# Altium footprint library con-molex.PCBLIB: 369 footprints (part 11 of 26)
Each footprint in its own frame and in the unit in brackets; x right, y up, seen from the top. Pads: shape width x height; smd on the part's side, far side on the other; paste and mask are expansions set on the pad; w line width, h text height; cw(c..) or ccw(c..) is an arc to the next point about the centre after c.
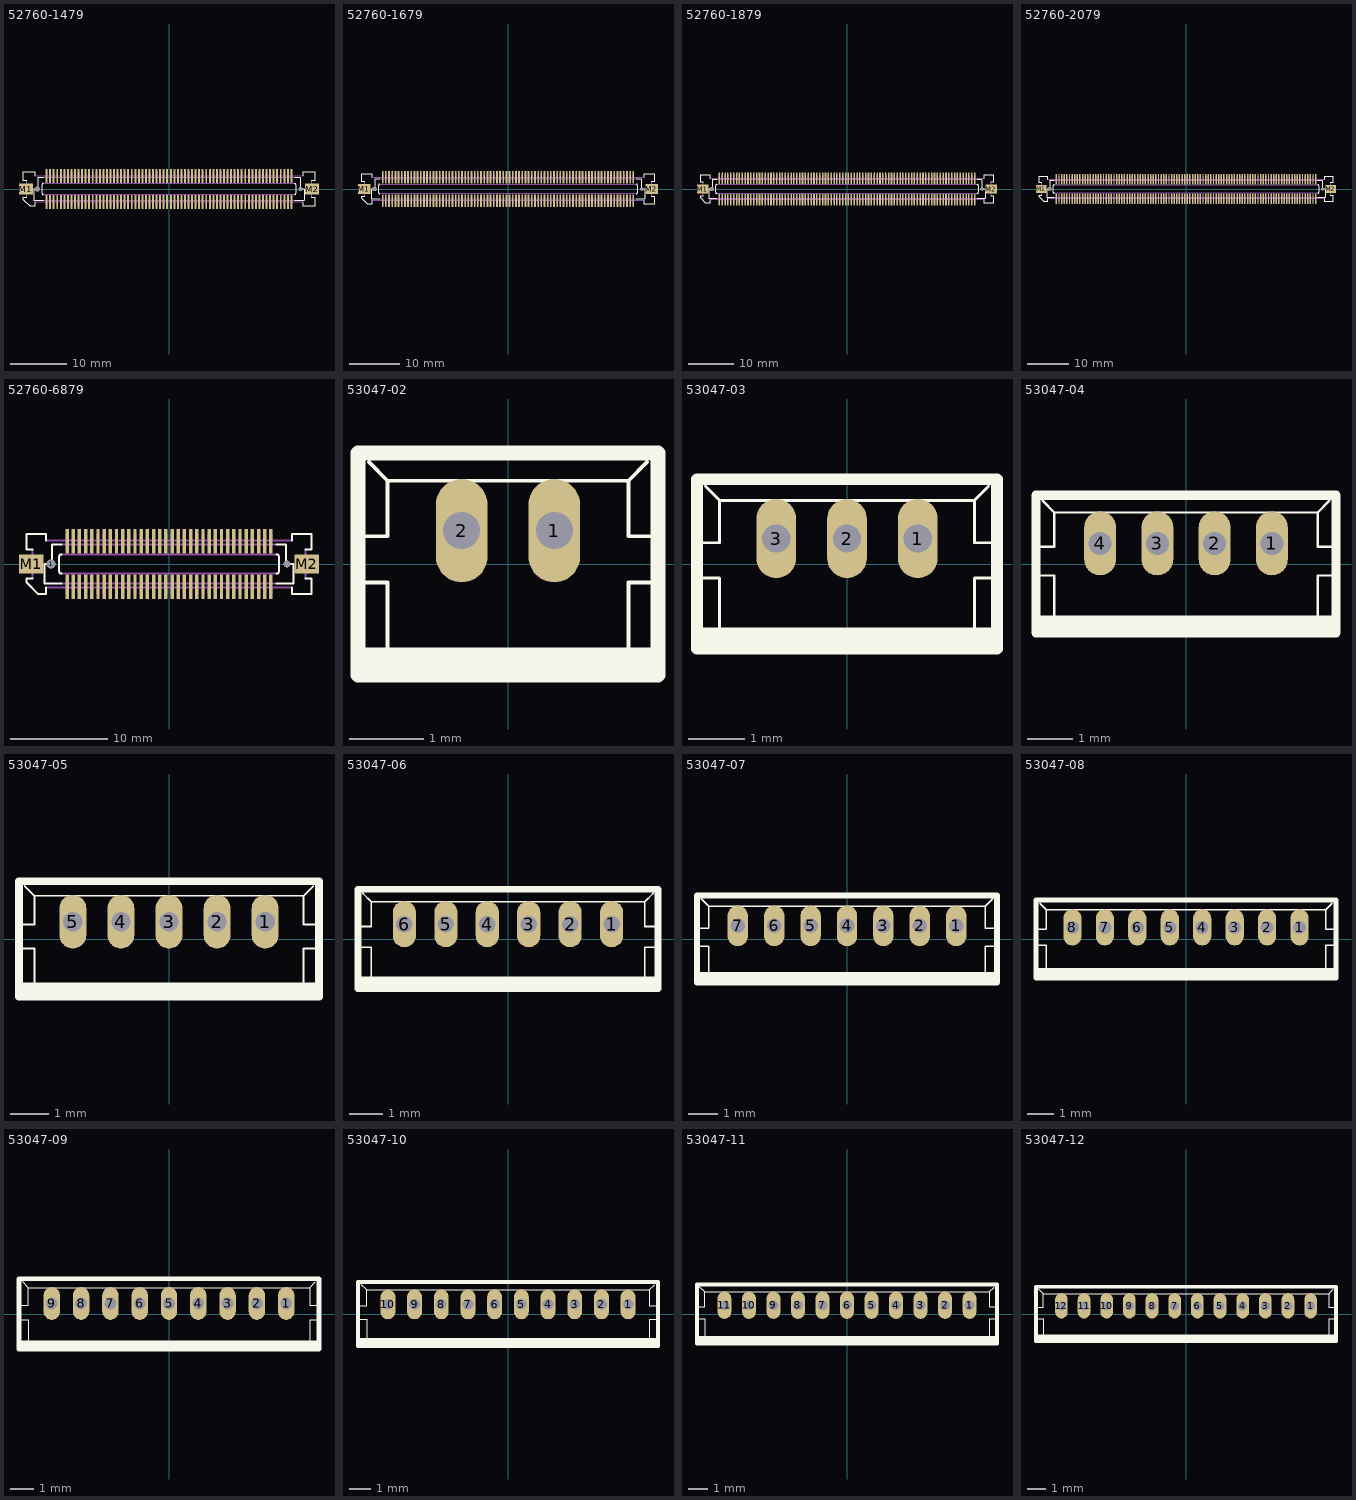
[diagram p10: the footprints below, top view; thin cyan lines are the x and y axes]

## 52760-1479 [mm]
pads (144):
  round 0.9 hole 0.9: 1(-23.56,0)
  rect 0.35x2.5 smd: 1(-21.907,-2.35) 2(-21.907,2.35) 3(-21.273,-2.35) 4(-21.273,2.35) 5(-20.637,-2.35) 6(-20.637,2.35) 7(-20.002,-2.35) 8(-20.002,2.35) 9(-19.367,-2.35) 10(-19.367,2.35) 11(-18.732,-2.35) 12(-18.732,2.35) 13(-18.098,-2.35) 14(-18.098,2.35) 15(-17.462,-2.35) 16(-17.462,2.35) 17(-16.828,-2.35) 18(-16.828,2.35) 19(-16.192,-2.35) 20(-16.192,2.35) 21(-15.557,-2.35) 22(-15.557,2.35) 23(-14.922,-2.35) 24(-14.922,2.35) 25(-14.287,-2.35) 26(-14.287,2.35) 27(-13.652,-2.35) 28(-13.652,2.35) 29(-13.018,-2.35) 30(-13.018,2.35) 31(-12.383,-2.35) 32(-12.383,2.35) 33(-11.747,-2.35) 34(-11.747,2.35) 35(-11.112,-2.35) 36(-11.112,2.35) 37(-10.477,-2.35) 38(-10.477,2.35) 39(-9.842,-2.35) 40(-9.842,2.35) 41(-9.207,-2.35) 42(-9.207,2.35) 43(-8.572,-2.35) 44(-8.572,2.35) 45(-7.938,-2.35) 46(-7.938,2.35) 47(-7.302,-2.35) 48(-7.302,2.35) 49(-6.667,-2.35) 50(-6.667,2.35) 51(-6.032,-2.35) 52(-6.032,2.35) 53(-5.397,-2.35) 54(-5.397,2.35) 55(-4.763,-2.35) 56(-4.763,2.35) 57(-4.127,-2.35) 58(-4.127,2.35) 59(-3.492,-2.35) 60(-3.492,2.35) 61(-2.857,-2.35) 62(-2.857,2.35) 63(-2.222,-2.35) 64(-2.222,2.35) 65(-1.587,-2.35) 66(-1.587,2.35) 67(-0.953,-2.35) 68(-0.953,2.35) 69(-0.318,-2.35) 70(-0.318,2.35) 71(0.318,-2.35) 72(0.318,2.35) 73(0.953,-2.35) 74(0.953,2.35) 75(1.587,-2.35) 76(1.587,2.35) 77(2.222,-2.35) 78(2.222,2.35) 79(2.857,-2.35) 80(2.857,2.35) 81(3.492,-2.35) 82(3.492,2.35) 83(4.127,-2.35) 84(4.127,2.35) 85(4.763,-2.35) 86(4.763,2.35) 87(5.397,-2.35) 88(5.397,2.35) 89(6.032,-2.35) 90(6.032,2.35) 91(6.667,-2.35) 92(6.667,2.35) 93(7.302,-2.35) 94(7.302,2.35) 95(7.938,-2.35) 96(7.938,2.35) 97(8.572,-2.35) 98(8.572,2.35) 99(9.207,-2.35) 100(9.207,2.35) 101(9.842,-2.35) 102(9.842,2.35) 103(10.477,-2.35) 104(10.477,2.35) 105(11.112,-2.35) 106(11.112,2.35) 107(11.747,-2.35) 108(11.747,2.35) 109(12.383,-2.35) 110(12.383,2.35) 111(13.018,-2.35) 112(13.018,2.35) 113(13.652,-2.35) 114(13.652,2.35) 115(14.287,-2.35) 116(14.287,2.35) 117(14.922,-2.35) 118(14.922,2.35) 119(15.557,-2.35) 120(15.557,2.35) 121(16.192,-2.35) 122(16.192,2.35) 123(16.828,-2.35) 124(16.828,2.35) 125(17.462,-2.35) 126(17.462,2.35) 127(18.098,-2.35) 128(18.098,2.35) 129(18.732,-2.35) 130(18.732,2.35) 131(19.367,-2.35) 132(19.367,2.35) 133(20.002,-2.35) 134(20.002,2.35) 135(20.637,-2.35) 136(20.637,2.35) 137(21.273,-2.35) 138(21.273,2.35) 139(21.907,-2.35) 140(21.907,2.35)
  round 0.7 hole 0.7: 1(23.56,0)
  rect 2.5x2 smd: M1(-25.6,0) M2(25.6,0)
Top Overlay:
  lines w0.203: -25.475,-1.5 -26.075,-1.5 -26.075,-1.9 -24.875,-3.1 -24.075,-3.1 -24.075,-2.4 ; -25.475,1.5 -26.075,1.5 -26.075,3.1 -24.075,3.1 -24.075,2.4 ; -22.475,-2 -24.225,-2 -24.225,0 -23.475,0 -23.475,2 -22.475,2 ; -22.475,-1 cw(c-22.475,-0.75) -22.725,-0.75 -22.725,0.75 cw(c-22.475,0.75) -22.475,1 ; 22.475,-2 24.225,-2 24.225,0 23.475,0 23.475,2 22.475,2 ; 22.475,-1 ccw(c22.475,-0.75) 22.725,-0.75 22.725,0.75 ccw(c22.475,0.75) 22.475,1 ; 24.075,-2.4 24.075,-3.1 26.075,-3.1 26.075,-1.5 25.475,-1.5 ; 24.075,2.4 24.075,3.1 26.075,3.1 26.075,1.5 25.475,1.5
Top Solder:
  rectangle: -22.107,-3.625 -21.708,-1.075
  region: -21.708,3.625 -22.107,3.625 -22.107,1.075 -21.708,1.075
  rectangle: -21.472,-3.625 -21.073,-1.075
  region: -21.073,3.625 -21.472,3.625 -21.472,1.075 -21.073,1.075
  rectangle: -20.837,-3.625 -20.438,-1.075
  region: -20.438,3.625 -20.837,3.625 -20.837,1.075 -20.438,1.075
  rectangle: -20.202,-3.625 -19.803,-1.075
  region: -19.803,3.625 -20.202,3.625 -20.202,1.075 -19.803,1.075
  rectangle: -19.567,-3.625 -19.168,-1.075
  region: -19.168,3.625 -19.567,3.625 -19.567,1.075 -19.168,1.075
  rectangle: -18.932,-3.625 -18.533,-1.075
  region: -18.533,3.625 -18.932,3.625 -18.932,1.075 -18.533,1.075
  rectangle: -18.297,-3.625 -17.898,-1.075
  region: -17.898,3.625 -18.297,3.625 -18.297,1.075 -17.898,1.075
  rectangle: -17.662,-3.625 -17.263,-1.075
  region: -17.263,3.625 -17.662,3.625 -17.662,1.075 -17.263,1.075
  rectangle: -17.027,-3.625 -16.628,-1.075
  region: -16.628,3.625 -17.027,3.625 -17.027,1.075 -16.628,1.075
  rectangle: -16.392,-3.625 -15.993,-1.075
  region: -15.993,3.625 -16.392,3.625 -16.392,1.075 -15.993,1.075
  rectangle: -15.757,-3.625 -15.358,-1.075
  region: -15.358,3.625 -15.757,3.625 -15.757,1.075 -15.358,1.075
  rectangle: -15.122,-3.625 -14.723,-1.075
  region: -14.723,3.625 -15.122,3.625 -15.122,1.075 -14.723,1.075
  rectangle: -14.487,-3.625 -14.088,-1.075
  region: -14.088,3.625 -14.487,3.625 -14.487,1.075 -14.088,1.075
  rectangle: -13.852,-3.625 -13.453,-1.075
  region: -13.453,3.625 -13.852,3.625 -13.852,1.075 -13.453,1.075
  rectangle: -13.217,-3.625 -12.818,-1.075
  region: -12.818,3.625 -13.217,3.625 -13.217,1.075 -12.818,1.075
  rectangle: -12.582,-3.625 -12.183,-1.075
  region: -12.183,3.625 -12.582,3.625 -12.582,1.075 -12.183,1.075
  rectangle: -11.947,-3.625 -11.548,-1.075
  region: -11.548,3.625 -11.947,3.625 -11.947,1.075 -11.548,1.075
  rectangle: -11.312,-3.625 -10.913,-1.075
  region: -10.913,3.625 -11.312,3.625 -11.312,1.075 -10.913,1.075
  rectangle: -10.677,-3.625 -10.278,-1.075
  region: -10.278,3.625 -10.677,3.625 -10.677,1.075 -10.278,1.075
  rectangle: -10.042,-3.625 -9.643,-1.075
  region: -9.643,3.625 -10.042,3.625 -10.042,1.075 -9.643,1.075
  rectangle: -9.407,-3.625 -9.008,-1.075
  region: -9.008,3.625 -9.407,3.625 -9.407,1.075 -9.008,1.075
  rectangle: -8.772,-3.625 -8.373,-1.075
  region: -8.373,3.625 -8.772,3.625 -8.772,1.075 -8.373,1.075
  rectangle: -8.137,-3.625 -7.738,-1.075
  region: -7.738,3.625 -8.137,3.625 -8.137,1.075 -7.738,1.075
  rectangle: -7.502,-3.625 -7.103,-1.075
  region: -7.103,3.625 -7.502,3.625 -7.502,1.075 -7.103,1.075
  rectangle: -6.867,-3.625 -6.468,-1.075
  region: -6.468,3.625 -6.867,3.625 -6.867,1.075 -6.468,1.075
  rectangle: -6.232,-3.625 -5.833,-1.075
  region: -5.833,3.625 -6.232,3.625 -6.232,1.075 -5.833,1.075
  rectangle: -5.597,-3.625 -5.198,-1.075
  region: -5.198,3.625 -5.597,3.625 -5.597,1.075 -5.198,1.075
  rectangle: -4.962,-3.625 -4.563,-1.075
  region: -4.563,3.625 -4.962,3.625 -4.962,1.075 -4.563,1.075
  rectangle: -4.327,-3.625 -3.928,-1.075
  region: -3.928,3.625 -4.327,3.625 -4.327,1.075 -3.928,1.075
  rectangle: -3.692,-3.625 -3.293,-1.075
  region: -3.293,3.625 -3.692,3.625 -3.692,1.075 -3.293,1.075
  rectangle: -3.057,-3.625 -2.658,-1.075
  region: -2.658,3.625 -3.057,3.625 -3.057,1.075 -2.658,1.075
  rectangle: -2.422,-3.625 -2.023,-1.075
  region: -2.023,3.625 -2.422,3.625 -2.422,1.075 -2.023,1.075
  rectangle: -1.787,-3.625 -1.388,-1.075
  region: -1.388,3.625 -1.787,3.625 -1.787,1.075 -1.388,1.075
  rectangle: -1.152,-3.625 -0.753,-1.075
  region: -0.753,3.625 -1.152,3.625 -1.152,1.075 -0.753,1.075
  rectangle: -0.517,-3.625 -0.118,-1.075
  region: -0.118,3.625 -0.517,3.625 -0.517,1.075 -0.118,1.075
  rectangle: 0.118,-3.625 0.517,-1.075
  region: 0.517,3.625 0.118,3.625 0.118,1.075 0.517,1.075
  rectangle: 0.753,-3.625 1.152,-1.075
  region: 1.152,3.625 0.753,3.625 0.753,1.075 1.152,1.075
  rectangle: 1.388,-3.625 1.787,-1.075
  region: 1.787,3.625 1.388,3.625 1.388,1.075 1.787,1.075
  rectangle: 2.023,-3.625 2.422,-1.075
  region: 2.422,3.625 2.023,3.625 2.023,1.075 2.422,1.075
  rectangle: 2.658,-3.625 3.057,-1.075
  region: 3.057,3.625 2.658,3.625 2.658,1.075 3.057,1.075
  rectangle: 3.293,-3.625 3.692,-1.075
  region: 3.692,3.625 3.293,3.625 3.293,1.075 3.692,1.075
  rectangle: 3.928,-3.625 4.327,-1.075
  region: 4.327,3.625 3.928,3.625 3.928,1.075 4.327,1.075
  rectangle: 4.563,-3.625 4.962,-1.075
  region: 4.962,3.625 4.563,3.625 4.563,1.075 4.962,1.075
  rectangle: 5.198,-3.625 5.597,-1.075
  region: 5.597,3.625 5.198,3.625 5.198,1.075 5.597,1.075
  rectangle: 5.833,-3.625 6.232,-1.075
  region: 6.232,3.625 5.833,3.625 5.833,1.075 6.232,1.075
  rectangle: 6.468,-3.625 6.867,-1.075
  region: 6.867,3.625 6.468,3.625 6.468,1.075 6.867,1.075
  rectangle: 7.103,-3.625 7.502,-1.075
  region: 7.502,3.625 7.103,3.625 7.103,1.075 7.502,1.075
  rectangle: 7.738,-3.625 8.137,-1.075
  region: 8.137,3.625 7.738,3.625 7.738,1.075 8.137,1.075
  rectangle: 8.373,-3.625 8.772,-1.075
  region: 8.772,3.625 8.373,3.625 8.373,1.075 8.772,1.075
  rectangle: 9.008,-3.625 9.407,-1.075
  region: 9.407,3.625 9.008,3.625 9.008,1.075 9.407,1.075
  rectangle: 9.643,-3.625 10.042,-1.075
  region: 10.042,3.625 9.643,3.625 9.643,1.075 10.042,1.075
  rectangle: 10.278,-3.625 10.677,-1.075
  region: 10.677,3.625 10.278,3.625 10.278,1.075 10.677,1.075
  rectangle: 10.913,-3.625 11.312,-1.075
  region: 11.312,3.625 10.913,3.625 10.913,1.075 11.312,1.075
  rectangle: 11.548,-3.625 11.947,-1.075
  region: 11.947,3.625 11.548,3.625 11.548,1.075 11.947,1.075
  rectangle: 12.183,-3.625 12.582,-1.075
  region: 12.582,3.625 12.183,3.625 12.183,1.075 12.582,1.075
  rectangle: 12.818,-3.625 13.217,-1.075
  region: 13.217,3.625 12.818,3.625 12.818,1.075 13.217,1.075
  rectangle: 13.453,-3.625 13.852,-1.075
  region: 13.852,3.625 13.453,3.625 13.453,1.075 13.852,1.075
  rectangle: 14.088,-3.625 14.487,-1.075
  region: 14.487,3.625 14.088,3.625 14.088,1.075 14.487,1.075
  rectangle: 14.723,-3.625 15.122,-1.075
  region: 15.122,3.625 14.723,3.625 14.723,1.075 15.122,1.075
  rectangle: 15.358,-3.625 15.757,-1.075
  region: 15.757,3.625 15.358,3.625 15.358,1.075 15.757,1.075
  rectangle: 15.993,-3.625 16.392,-1.075
  region: 16.392,3.625 15.993,3.625 15.993,1.075 16.392,1.075
  rectangle: 16.628,-3.625 17.027,-1.075
  region: 17.027,3.625 16.628,3.625 16.628,1.075 17.027,1.075
  rectangle: 17.263,-3.625 17.662,-1.075
  region: 17.662,3.625 17.263,3.625 17.263,1.075 17.662,1.075
  rectangle: 17.898,-3.625 18.297,-1.075
  region: 18.297,3.625 17.898,3.625 17.898,1.075 18.297,1.075
  rectangle: 18.533,-3.625 18.932,-1.075
  region: 18.932,3.625 18.533,3.625 18.533,1.075 18.932,1.075
  rectangle: 19.168,-3.625 19.567,-1.075
  region: 19.567,3.625 19.168,3.625 19.168,1.075 19.567,1.075
  rectangle: 19.803,-3.625 20.202,-1.075
  region: 20.202,3.625 19.803,3.625 19.803,1.075 20.202,1.075
  rectangle: 20.438,-3.625 20.837,-1.075
  region: 20.837,3.625 20.438,3.625 20.438,1.075 20.837,1.075
  rectangle: 21.073,-3.625 21.472,-1.075
  region: 21.472,3.625 21.073,3.625 21.073,1.075 21.472,1.075
  rectangle: 21.708,-3.625 22.107,-1.075
  region: 22.107,3.625 21.708,3.625 21.708,1.075 22.107,1.075
Mechanical 16:
  rectangle: -22.058,-3.1 -21.757,-2.375
  region: -21.757,3.1 -22.058,3.1 -22.058,2.375 -21.757,2.375
  rectangle: -21.423,-3.1 -21.122,-2.375
  region: -21.122,3.1 -21.423,3.1 -21.423,2.375 -21.122,2.375
  rectangle: -20.788,-3.1 -20.487,-2.375
  region: -20.487,3.1 -20.788,3.1 -20.788,2.375 -20.487,2.375
  rectangle: -20.153,-3.1 -19.852,-2.375
  region: -19.852,3.1 -20.153,3.1 -20.153,2.375 -19.852,2.375
  rectangle: -19.518,-3.1 -19.217,-2.375
  region: -19.217,3.1 -19.518,3.1 -19.518,2.375 -19.217,2.375
  rectangle: -18.883,-3.1 -18.582,-2.375
  region: -18.582,3.1 -18.883,3.1 -18.883,2.375 -18.582,2.375
  rectangle: -18.248,-3.1 -17.947,-2.375
  region: -17.947,3.1 -18.248,3.1 -18.248,2.375 -17.947,2.375
  rectangle: -17.613,-3.1 -17.312,-2.375
  region: -17.312,3.1 -17.613,3.1 -17.613,2.375 -17.312,2.375
  rectangle: -16.978,-3.1 -16.677,-2.375
  region: -16.677,3.1 -16.978,3.1 -16.978,2.375 -16.677,2.375
  rectangle: -16.343,-3.1 -16.042,-2.375
  region: -16.042,3.1 -16.343,3.1 -16.343,2.375 -16.042,2.375
  rectangle: -15.708,-3.1 -15.407,-2.375
  region: -15.407,3.1 -15.708,3.1 -15.708,2.375 -15.407,2.375
  rectangle: -15.073,-3.1 -14.772,-2.375
  region: -14.772,3.1 -15.073,3.1 -15.073,2.375 -14.772,2.375
  rectangle: -14.438,-3.1 -14.137,-2.375
  region: -14.137,3.1 -14.438,3.1 -14.438,2.375 -14.137,2.375
  rectangle: -13.803,-3.1 -13.502,-2.375
  region: -13.502,3.1 -13.803,3.1 -13.803,2.375 -13.502,2.375
  rectangle: -13.168,-3.1 -12.867,-2.375
  region: -12.867,3.1 -13.168,3.1 -13.168,2.375 -12.867,2.375
  rectangle: -12.533,-3.1 -12.232,-2.375
  region: -12.232,3.1 -12.533,3.1 -12.533,2.375 -12.232,2.375
  rectangle: -11.898,-3.1 -11.597,-2.375
  region: -11.597,3.1 -11.898,3.1 -11.898,2.375 -11.597,2.375
  rectangle: -11.263,-3.1 -10.962,-2.375
  region: -10.962,3.1 -11.263,3.1 -11.263,2.375 -10.962,2.375
  rectangle: -10.628,-3.1 -10.327,-2.375
  region: -10.327,3.1 -10.628,3.1 -10.628,2.375 -10.327,2.375
  rectangle: -9.993,-3.1 -9.692,-2.375
  region: -9.692,3.1 -9.993,3.1 -9.993,2.375 -9.692,2.375
  rectangle: -9.358,-3.1 -9.057,-2.375
  region: -9.057,3.1 -9.358,3.1 -9.358,2.375 -9.057,2.375
  rectangle: -8.723,-3.1 -8.422,-2.375
  region: -8.422,3.1 -8.723,3.1 -8.723,2.375 -8.422,2.375
  rectangle: -8.088,-3.1 -7.787,-2.375
  region: -7.787,3.1 -8.088,3.1 -8.088,2.375 -7.787,2.375
  rectangle: -7.453,-3.1 -7.152,-2.375
  region: -7.152,3.1 -7.453,3.1 -7.453,2.375 -7.152,2.375
  rectangle: -6.818,-3.1 -6.517,-2.375
  region: -6.517,3.1 -6.818,3.1 -6.818,2.375 -6.517,2.375
  rectangle: -6.183,-3.1 -5.882,-2.375
  region: -5.882,3.1 -6.183,3.1 -6.183,2.375 -5.882,2.375
  rectangle: -5.548,-3.1 -5.247,-2.375
  region: -5.247,3.1 -5.548,3.1 -5.548,2.375 -5.247,2.375
  rectangle: -4.913,-3.1 -4.612,-2.375
  region: -4.612,3.1 -4.913,3.1 -4.913,2.375 -4.612,2.375
  rectangle: -4.278,-3.1 -3.977,-2.375
  region: -3.977,3.1 -4.278,3.1 -4.278,2.375 -3.977,2.375
  rectangle: -3.643,-3.1 -3.342,-2.375
  region: -3.342,3.1 -3.643,3.1 -3.643,2.375 -3.342,2.375
  rectangle: -3.008,-3.1 -2.707,-2.375
  region: -2.707,3.1 -3.008,3.1 -3.008,2.375 -2.707,2.375
  rectangle: -2.373,-3.1 -2.072,-2.375
  region: -2.072,3.1 -2.373,3.1 -2.373,2.375 -2.072,2.375
  rectangle: -1.738,-3.1 -1.437,-2.375
  region: -1.437,3.1 -1.738,3.1 -1.738,2.375 -1.437,2.375
  rectangle: -1.103,-3.1 -0.802,-2.375
  region: -0.802,3.1 -1.103,3.1 -1.103,2.375 -0.802,2.375
  rectangle: -0.468,-3.1 -0.167,-2.375
  region: -0.167,3.1 -0.468,3.1 -0.468,2.375 -0.167,2.375
  rectangle: 0.167,-3.1 0.468,-2.375
  region: 0.468,3.1 0.167,3.1 0.167,2.375 0.468,2.375
  rectangle: 0.802,-3.1 1.103,-2.375
  region: 1.103,3.1 0.802,3.1 0.802,2.375 1.103,2.375
  rectangle: 1.437,-3.1 1.738,-2.375
  region: 1.738,3.1 1.437,3.1 1.437,2.375 1.738,2.375
  rectangle: 2.072,-3.1 2.373,-2.375
  region: 2.373,3.1 2.072,3.1 2.072,2.375 2.373,2.375
  rectangle: 2.707,-3.1 3.008,-2.375
  region: 3.008,3.1 2.707,3.1 2.707,2.375 3.008,2.375
  rectangle: 3.342,-3.1 3.643,-2.375
  region: 3.643,3.1 3.342,3.1 3.342,2.375 3.643,2.375
  rectangle: 3.977,-3.1 4.278,-2.375
  region: 4.278,3.1 3.977,3.1 3.977,2.375 4.278,2.375
  rectangle: 4.612,-3.1 4.913,-2.375
  region: 4.913,3.1 4.612,3.1 4.612,2.375 4.913,2.375
  rectangle: 5.247,-3.1 5.548,-2.375
  region: 5.548,3.1 5.247,3.1 5.247,2.375 5.548,2.375
  rectangle: 5.882,-3.1 6.183,-2.375
  region: 6.183,3.1 5.882,3.1 5.882,2.375 6.183,2.375
  rectangle: 6.517,-3.1 6.818,-2.375
  region: 6.818,3.1 6.517,3.1 6.517,2.375 6.818,2.375
  rectangle: 7.152,-3.1 7.453,-2.375
  region: 7.453,3.1 7.152,3.1 7.152,2.375 7.453,2.375
  rectangle: 7.787,-3.1 8.088,-2.375
  region: 8.088,3.1 7.787,3.1 7.787,2.375 8.088,2.375
  rectangle: 8.422,-3.1 8.723,-2.375
  region: 8.723,3.1 8.422,3.1 8.422,2.375 8.723,2.375
  rectangle: 9.057,-3.1 9.358,-2.375
  region: 9.358,3.1 9.057,3.1 9.057,2.375 9.358,2.375
  rectangle: 9.692,-3.1 9.993,-2.375
  region: 9.993,3.1 9.692,3.1 9.692,2.375 9.993,2.375
  rectangle: 10.327,-3.1 10.628,-2.375
  region: 10.628,3.1 10.327,3.1 10.327,2.375 10.628,2.375
  rectangle: 10.962,-3.1 11.263,-2.375
  region: 11.263,3.1 10.962,3.1 10.962,2.375 11.263,2.375
  rectangle: 11.597,-3.1 11.898,-2.375
  region: 11.898,3.1 11.597,3.1 11.597,2.375 11.898,2.375
  rectangle: 12.232,-3.1 12.533,-2.375
  region: 12.533,3.1 12.232,3.1 12.232,2.375 12.533,2.375
  rectangle: 12.867,-3.1 13.168,-2.375
  region: 13.168,3.1 12.867,3.1 12.867,2.375 13.168,2.375
  rectangle: 13.502,-3.1 13.803,-2.375
  region: 13.803,3.1 13.502,3.1 13.502,2.375 13.803,2.375
  rectangle: 14.137,-3.1 14.438,-2.375
  region: 14.438,3.1 14.137,3.1 14.137,2.375 14.438,2.375
  rectangle: 14.772,-3.1 15.073,-2.375
  region: 15.073,3.1 14.772,3.1 14.772,2.375 15.073,2.375
  rectangle: 15.407,-3.1 15.708,-2.375
  region: 15.708,3.1 15.407,3.1 15.407,2.375 15.708,2.375
  rectangle: 16.042,-3.1 16.343,-2.375
  region: 16.343,3.1 16.042,3.1 16.042,2.375 16.343,2.375
  rectangle: 16.677,-3.1 16.978,-2.375
  region: 16.978,3.1 16.677,3.1 16.677,2.375 16.978,2.375
  rectangle: 17.312,-3.1 17.613,-2.375
  region: 17.613,3.1 17.312,3.1 17.312,2.375 17.613,2.375
  rectangle: 17.947,-3.1 18.248,-2.375
  region: 18.248,3.1 17.947,3.1 17.947,2.375 18.248,2.375
  rectangle: 18.582,-3.1 18.883,-2.375
  region: 18.883,3.1 18.582,3.1 18.582,2.375 18.883,2.375
  rectangle: 19.217,-3.1 19.518,-2.375
  region: 19.518,3.1 19.217,3.1 19.217,2.375 19.518,2.375
  rectangle: 19.852,-3.1 20.153,-2.375
  region: 20.153,3.1 19.852,3.1 19.852,2.375 20.153,2.375
  rectangle: 20.487,-3.1 20.788,-2.375
  region: 20.788,3.1 20.487,3.1 20.487,2.375 20.788,2.375
  rectangle: 21.122,-3.1 21.423,-2.375
  region: 21.423,3.1 21.122,3.1 21.122,2.375 21.423,2.375
  rectangle: 21.757,-3.1 22.058,-2.375
  region: 22.058,3.1 21.757,3.1 21.757,2.375 22.058,2.375
  lines w0.203: -25.475,-1.5 -25.475,1.5 ; -24.075,-2.4 24.075,-2.4 ; -24.075,2.4 24.075,2.4 ; -22.475,-2 22.475,-2 ; -22.475,-1 22.475,-1 ; -22.475,1 22.475,1 ; -22.475,2 22.475,2 ; 25.475,-1.5 25.475,1.5

## 52760-1679 [mm]
pads (164):
  round 0.9 hole 0.9: 1(-26.735,0)
  rect 0.35x2.5 smd: 1(-25.082,-2.35) 2(-25.082,2.35) 3(-24.447,-2.35) 4(-24.447,2.35) 5(-23.812,-2.35) 6(-23.812,2.35) 7(-23.177,-2.35) 8(-23.177,2.35) 9(-22.543,-2.35) 10(-22.543,2.35) 11(-21.907,-2.35) 12(-21.907,2.35) 13(-21.273,-2.35) 14(-21.273,2.35) 15(-20.637,-2.35) 16(-20.637,2.35) 17(-20.002,-2.35) 18(-20.002,2.35) 19(-19.367,-2.35) 20(-19.367,2.35) 21(-18.732,-2.35) 22(-18.732,2.35) 23(-18.098,-2.35) 24(-18.098,2.35) 25(-17.462,-2.35) 26(-17.462,2.35) 27(-16.828,-2.35) 28(-16.828,2.35) 29(-16.192,-2.35) 30(-16.192,2.35) 31(-15.557,-2.35) 32(-15.557,2.35) 33(-14.922,-2.35) 34(-14.922,2.35) 35(-14.287,-2.35) 36(-14.287,2.35) 37(-13.652,-2.35) 38(-13.652,2.35) 39(-13.018,-2.35) 40(-13.018,2.35) 41(-12.383,-2.35) 42(-12.383,2.35) 43(-11.747,-2.35) 44(-11.747,2.35) 45(-11.112,-2.35) 46(-11.112,2.35) 47(-10.477,-2.35) 48(-10.477,2.35) 49(-9.842,-2.35) 50(-9.842,2.35) 51(-9.207,-2.35) 52(-9.207,2.35) 53(-8.572,-2.35) 54(-8.572,2.35) 55(-7.938,-2.35) 56(-7.938,2.35) 57(-7.302,-2.35) 58(-7.302,2.35) 59(-6.667,-2.35) 60(-6.667,2.35) 61(-6.032,-2.35) 62(-6.032,2.35) 63(-5.397,-2.35) 64(-5.397,2.35) 65(-4.763,-2.35) 66(-4.763,2.35) 67(-4.127,-2.35) 68(-4.127,2.35) 69(-3.492,-2.35) 70(-3.492,2.35) 71(-2.857,-2.35) 72(-2.857,2.35) 73(-2.222,-2.35) 74(-2.222,2.35) 75(-1.587,-2.35) 76(-1.587,2.35) 77(-0.953,-2.35) 78(-0.953,2.35) 79(-0.318,-2.35) 80(-0.318,2.35) 81(0.318,-2.35) 82(0.318,2.35) 83(0.953,-2.35) 84(0.953,2.35) 85(1.587,-2.35) 86(1.587,2.35) 87(2.222,-2.35) 88(2.222,2.35) 89(2.857,-2.35) 90(2.857,2.35) 91(3.492,-2.35) 92(3.492,2.35) 93(4.127,-2.35) 94(4.127,2.35) 95(4.763,-2.35) 96(4.763,2.35) 97(5.397,-2.35) 98(5.397,2.35) 99(6.032,-2.35) 100(6.032,2.35) 101(6.667,-2.35) 102(6.667,2.35) 103(7.302,-2.35) 104(7.302,2.35) 105(7.938,-2.35) 106(7.938,2.35) 107(8.572,-2.35) 108(8.572,2.35) 109(9.207,-2.35) 110(9.207,2.35) 111(9.842,-2.35) 112(9.842,2.35) 113(10.477,-2.35) 114(10.477,2.35) 115(11.112,-2.35) 116(11.112,2.35) 117(11.747,-2.35) 118(11.747,2.35) 119(12.383,-2.35) 120(12.383,2.35) 121(13.018,-2.35) 122(13.018,2.35) 123(13.652,-2.35) 124(13.652,2.35) 125(14.287,-2.35) 126(14.287,2.35) 127(14.922,-2.35) 128(14.922,2.35) 129(15.557,-2.35) 130(15.557,2.35) 131(16.192,-2.35) 132(16.192,2.35) 133(16.828,-2.35) 134(16.828,2.35) 135(17.462,-2.35) 136(17.462,2.35) 137(18.098,-2.35) 138(18.098,2.35) 139(18.732,-2.35) 140(18.732,2.35) 141(19.367,-2.35) 142(19.367,2.35) 143(20.002,-2.35) 144(20.002,2.35) 145(20.637,-2.35) 146(20.637,2.35) 147(21.273,-2.35) 148(21.273,2.35) 149(21.907,-2.35) 150(21.907,2.35) 151(22.543,-2.35) 152(22.543,2.35) 153(23.177,-2.35) 154(23.177,2.35) 155(23.812,-2.35) 156(23.812,2.35) 157(24.447,-2.35) 158(24.447,2.35) 159(25.082,-2.35) 160(25.082,2.35)